# Altium footprint library Atlan.PcbLib: 283 footprints (part 4 of 18)
Each footprint in its own frame and in the unit in brackets; x right, y up, seen from the top. Pads: shape width x height; smd on the part's side, far side on the other; paste and mask are expansions set on the pad; w line width, h text height; cw(c..) or ccw(c..) is an arc to the next point about the centre after c.
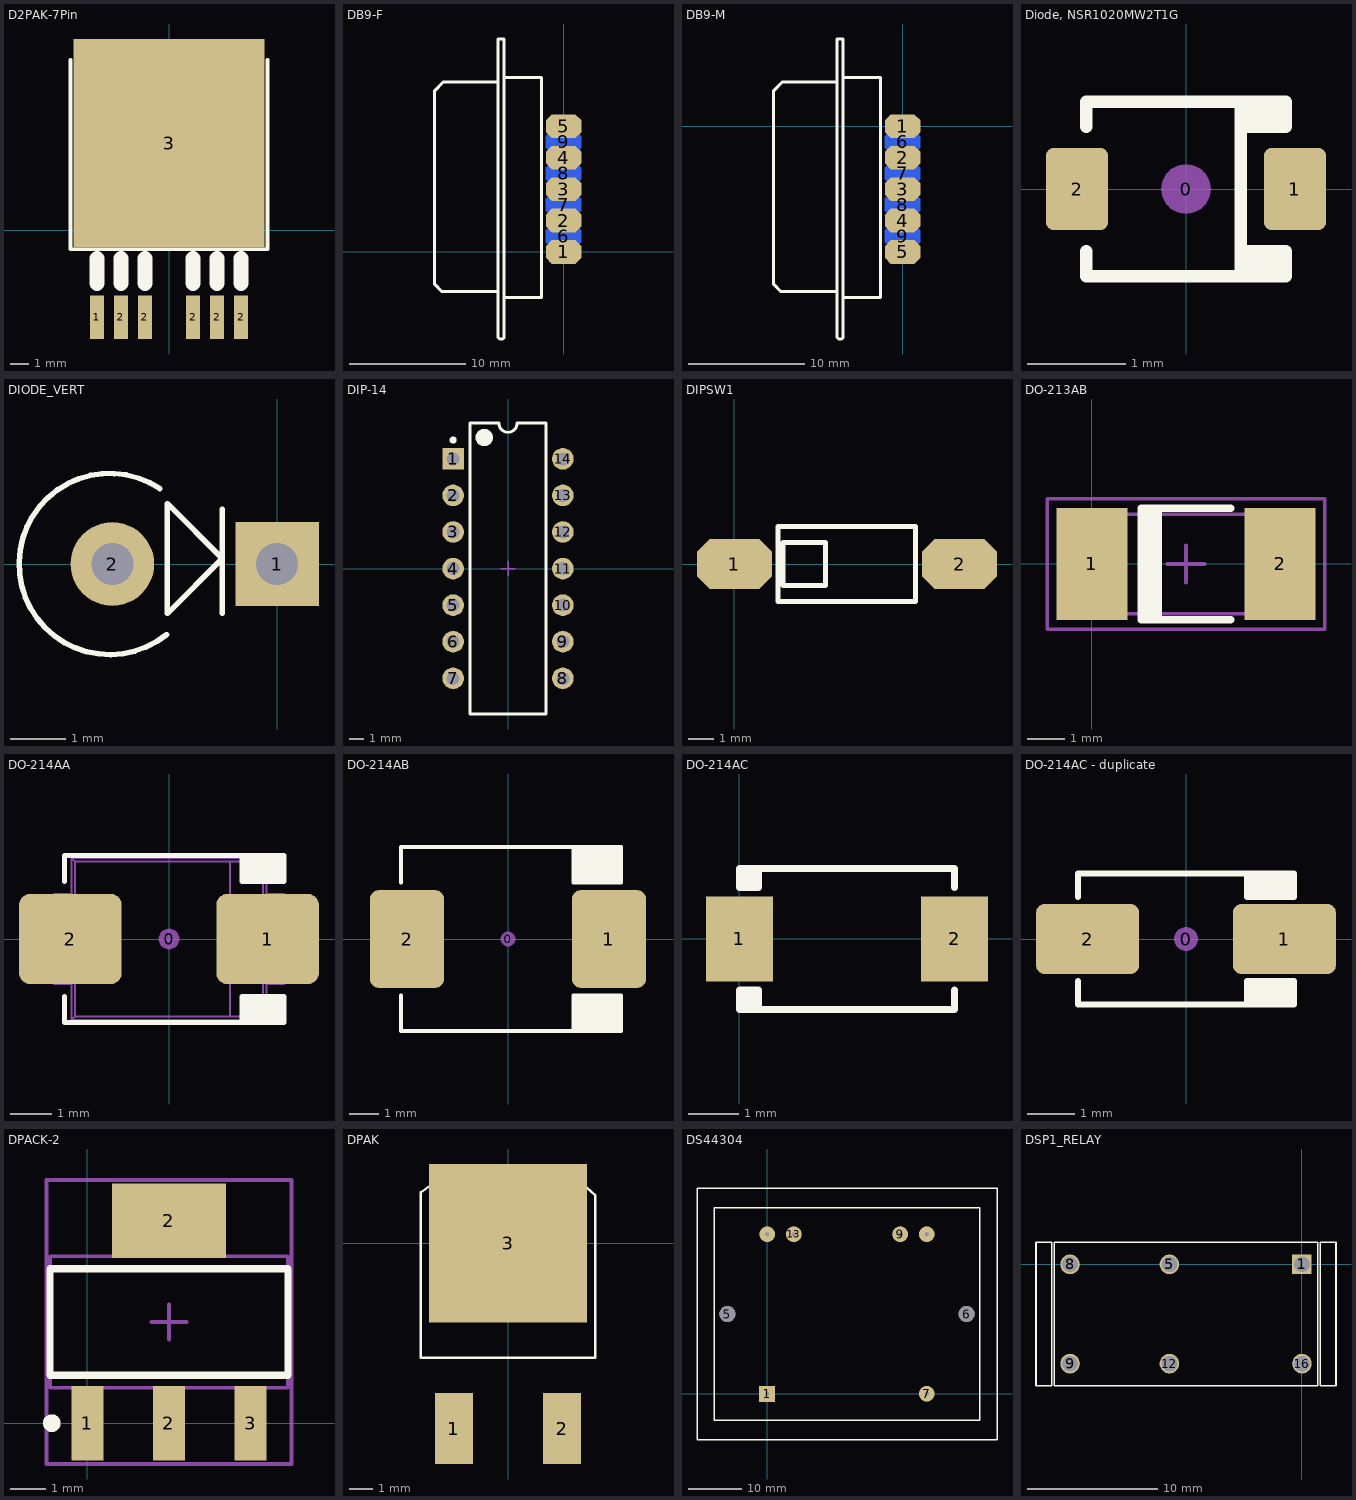
[diagram p3: the footprints below, top view; thin cyan lines are the x and y axes]

## D2PAK-7Pin [mm] "Mosfet"
pads (7):
  rect 0.75x2.285 smd: 1(-3.81,-4.6) 2(-2.54,-4.6) 2(-1.27,-4.6) 2(1.27,-4.6) 2(2.54,-4.6) 2(3.81,-4.6)
  rect 10.095x11 smd: 3(0,4.6)
Top Overlay:
  lines w0.2: -5.2,9 -5.2,-1 5.2,-1 5.2,9
  lines w0.8: -3.81,-2.8 -3.81,-1.5 ; -2.54,-2.8 -2.54,-1.5 ; -1.27,-2.8 -1.27,-1.5 ; 1.27,-2.8 1.27,-1.5 ; 2.54,-2.8 2.54,-1.5 ; 3.8,-2.8 3.8,-1.5
3D body "d2pak7_ST.STEP": height 4.52, standoff 0.02, extent -5.107,-5.5 5.107,9.606

## DB9-F [mil]
pads (9):
  oct 120x80 smd: 1(0,0) 2(0,106.3) 3(0,212.6) 4(0,318.9) 5(0,425.2)
  oct 120x80 smd far side: 6(0,53.15) 7(0,159.45) 8(0,265.75) 9(0,372.05)
Top Overlay:
  lines w10: -221.14,-134.49 -411.14,-134.49 -436.14,-109.49 -436.14,545.51 -406.14,575.51 -221.14,575.51 ; -201.14,-154.49 -201.14,590.51 -75,590.51 -75,-154.49 -201.14,-154.49 ; -201.14,-154.49 -201.14,-289.49 -206.14,-294.49 -216.14,-294.49 -221.14,-289.49 -221.14,720.51 -201.14,720.51 -201.14,-154.49

## DB9-M [mil]
pads (9):
  oct 120x80 smd: 1(0,0) 2(0,-106.3) 3(0,-212.6) 4(0,-318.9) 5(0,-425.2)
  oct 120x80 smd far side: 6(0,-53.15) 7(0,-159.45) 8(0,-265.75) 9(0,-372.05)
Top Overlay:
  lines w10: -221.14,-559.68 -411.14,-559.68 -436.14,-534.68 -436.14,120.31 -406.14,150.32 -221.14,150.31 ; -201.14,-579.68 -201.14,165.31 -75,165.32 -75,-579.69 -201.14,-579.68 ; -201.14,-579.68 -201.14,-714.69 -206.14,-719.69 -216.14,-719.69 -221.14,-714.68 -221.14,295.31 -201.14,295.31 -201.14,-579.68

## Diode, NSR1020MW2T1G [mil]
pads (3):
  round 20 on Mech15: 0(0,0)
  rrect25% 25x33 smd: 1(43.75,0) 2(-43.75,0)
Top Overlay:
  lines w5: -40,-25 -40,-35 40,-35 40,-25 22,-25 ; -40,25 -40,35 40,35 40,25 22,25 ; 22,-35 22,35 ; 25,-35 25,-25 ; 25,25 25,35 ; 28,-35 28,-25 ; 28,25 28,35 ; 31,-35 31,-25 ; 31,25 31,35 ; 34,-35 34,-25 ; 34,25 34,35 ; 37,-35 37,-25 ; 37,25 37,35

## DIODE_VERT [mil]
pads (2):
  rect 60x60 hole 30: 1(0,0)
  round 60 hole 30: 2(-118.11,0)
Top Overlay:
  lines w3.94: -84.05,54.05 ccw(c-120.08,0) -79.26,-50.54
  lines w4: -39.37,-35.43 -39.37,39.37 ; -78.74,-35.43 -78.74,-11.81 -78.74,23.62 -78.74,43.31 -39.37,3.94 -78.74,-35.43
3D body: height 255.91, standoff 0, extent -185.04,-62.99 -55.63,66.67

## DIP-14 [mm] "DIP, 14-Pin, Row Spacing 7.62 mm, Pitch 2.54 mm"
height 5.08
pads (14):
  rect 1.5x1.5 hole 0.9: 1(-3.81,7.62)
  round 1.5 hole 0.9: 2(-3.81,5.08) 3(-3.81,2.54) 4(-3.81,0) 5(-3.81,-2.54) 6(-3.81,-5.08) 7(-3.81,-7.62) 8(3.81,-7.62) 9(3.81,-5.08) 10(3.81,-2.54) 11(3.81,0) 12(3.81,2.54) 13(3.81,5.08) 14(3.81,7.62)
Top Overlay:
  circle w0.6: c-1.65,9.1 r0.3
  circle w0.25: c-3.81,8.92 r0.125
  lines w0.2: -2.65,-10.1 2.65,-10.1 2.65,10.1 0.635,10.1 cw(c0,10.1) -0.635,10.1 -2.65,10.1 -2.65,-10.1
Mechanical 15:
  lines w0.1: -0.5,0 0.5,0 ; 0,-0.5 0,0.5
3D body "DIL14.stp": height 4, standoff -4.3, extent -3.81,-9.6 3.81,9.6

## DIPSW1 [mm]
pads (2):
  oct 3x2 smd: 1(0,0) 2(9,0)
Top Overlay:
  lines w0.2: 1.75,-1.5 7.25,-1.5 7.25,1.5 1.75,1.5 1.75,-1.5 ; 1.942,-0.853 1.942,0.853 3.647,0.853 3.647,-0.853 1.942,-0.853
3D body: height 2.5, standoff 0, extent 1.7,-1.6 7.3,1.6
3D body: height 3.5, standoff 2.5, extent 2.1,-0.7 3.5,0.7
3D body: height 2.51, standoff 2.5, extent 3.5,-0.7 6.7,0.7

## DO-213AB [mm] "MELF Diode, 2-Leads, Body 6,0x2,5mm, IPC Medium Density"
height 2.67
pads (2):
  rect 1.9x3 smd: 1(0,0) 2(5.05,0)
Top Overlay:
  rectangle: 1.325,-1.5 1.875,1.5
  lines w0.2: 3.725,-1.5 1.325,-1.5 1.325,1.5 3.725,1.5
Mechanical 13:
  rectangle: -0.475,-1.335 0.332,1.335
  lines w0.1: -0.475,-1.335 -0.475,1.335 5.525,1.335 5.525,-1.335 -0.475,-1.335
Mechanical 15:
  lines w0.1: 2.025,0 3.025,0 ; 2.525,-0.5 2.525,0.5 ; -1.2,-1.75 -1.2,1.75 6.25,1.75 6.25,-1.75 -1.2,-1.75
3D body: height 2.67, standoff 0, extent -0.475,-1.335 5.525,1.335

## DO-214AA [mm] "JEDEC DO214 variation AA. SMB"
height 2.65
pads (3):
  round 0.508 on Mech15: 0(0,0)
  rrect25% 2.5x2.2 smd: 1(2.4,0) 2(-2.4,0)
Top Overlay:
  region: 1.778,-1.397 1.778,-2.032 2.794,-2.032 2.794,-1.397
  region: 1.778,1.397 1.778,2.032 2.794,2.032 2.794,1.397
  lines w0.127: -2.54,-1.397 -2.54,-2.032 1.778,-2.032 ; -2.54,1.397 -2.54,2.032 1.778,2.032 ; 1.778,-2.032 2.794,-2.032 2.794,-1.397 1.778,-1.397 1.778,-2.032 ; 1.778,2.032 1.778,1.397 2.794,1.397 2.794,2.032 1.778,2.032
Mechanical 13:
  lines w0.05: -2.375,-1.1 -2.375,-1.973 ; -2.375,1.1 -2.375,1.973 ; 2.375,-1.1 2.375,-1.973 ; 2.375,1.1 2.375,1.973 ; -2.375,-1.973 -2.285,-1.883 ; -2.375,-1.973 -2.373,-1.975 2.373,-1.975 2.375,-1.973 ; -2.375,1.973 -2.285,1.883 ; -2.375,1.973 -2.373,1.975 2.373,1.975 2.375,1.973 ; -2.285,-1.883 -2.285,1.883 ; -2.285,-1.883 1.485,-1.884 ; -2.285,1.883 1.485,1.884 ; 1.485,-1.884 1.485,1.884 ; 1.485,-1.884 2.285,-1.884 ; 1.485,1.884 2.285,1.884 ; 2.285,-1.884 2.375,-1.973 ; 2.285,-1.884 2.285,1.884 ; 2.285,1.884 2.375,1.973 ; -2.8,-1.1 -2.8,1.1 -2.356,1.1 -2.356,-1.1 -2.8,-1.1 ; 2.356,-1.1 2.356,1.1 2.8,1.1 2.8,-1.1 2.356,-1.1
3D body "DO-214AA.STEP": height 2.62, standoff 0, extent -2.8,-1.975 2.8,1.975

## DO-214AB [mm] "JEDEC DO214 variation AB. SMC"
height 2.5
pads (3):
  round 0.508 on Mech15: 0(0,0)
  rrect25% 2.5x3.3 smd: 1(3.4,0) 2(-3.4,0)
Top Overlay:
  rectangle: 2.2,1.9 3.8,3.1
  rectangle: 2.2,-3.1 3.8,-1.9
  lines w0.127: -3.6,-1.9 -3.6,-3.1 3.8,-3.1 3.8,-1.9 2.2,-1.9 2.2,-3.1 ; -3.6,1.9 -3.6,3.1 3.8,3.1 3.8,1.9 2.2,1.9 2.2,3.1
3D body: height 2.62, standoff 0.01, extent -3.975,-2.975 4.05,2.975

## DO-214AC [mm] "Diode"
pads (2):
  rect 1.32x1.68 smd: 1(0,0) 2(4.26,0)
Top Overlay:
  lines w0.14: 0,-1.017 0,-1.4 4.26,-1.4 4.26,-1.016 ; 0,-1.016 0.381,-1.016 ; 0.127,-1.4 0.127,-1.016 ; 0.127,1.016 0.127,1.397 ; 0.254,-1.397 0.254,-1.016 ; 0.254,1.016 0.254,1.397 ; 0.381,-1.4 0.381,-1.014 ; 0.381,1.397 0.381,1.016 0,1.016 0,1.397 4.26,1.397 4.26,1.016

## DO-214AC - duplicate [mm] "JEDEC DO214 variation AC. SMA"
height 2.5
pads (3):
  round 0.508 on Mech15: 0(0,0)
  rrect25% 2.2x1.5 smd: 1(2.1,0) 2(-2.1,0)
Top Overlay:
  rectangle: 1.3,-1.4 2.3,-0.9
  rectangle: 1.3,0.9 2.3,1.4
  lines w0.127: -2.3,-0.9 -2.3,-1.4 2.3,-1.4 2.3,-0.9 1.3,-0.9 1.3,-1.4 ; -2.3,0.9 -2.3,1.4 2.3,1.4 2.3,0.9 1.3,0.9 ; 1.3,0.911 1.3,1.4
3D body "SW3dPS-DO-214AC SMA.STEP": height 2.42, standoff 0.02, extent -2.6,-1.3 2.6,1.3

## DPACK-2 [mm]
pads (4):
  rect 0.9x2.1 smd: 1(0,0) 2(2.3,0) 3(4.6,0)
  rect 3.2x2.1 smd: 2(2.3,5.7)
Top Overlay:
  circle w0.25: c-1,0 r0.125
  lines w0.2: -1.05,1.35 -1.05,4.35 5.65,4.35 5.65,1.35 -1.05,1.35
Mechanical 13:
  lines w0.1: -1.05,1 -1.05,4.7 5.65,4.7 5.65,1 -1.05,1
Mechanical 15:
  lines w0.1: 1.8,2.85 2.8,2.85 ; 2.3,2.35 2.3,3.35 ; -1.15,-1.15 -1.15,6.85 5.75,6.85 5.75,-1.15 -1.15,-1.15
3D body: height 1.7, standoff 0, extent -1.05,1 5.65,4.7

## DPAK [mm]
pads (3):
  rect 1.6x3 smd: 1(-2.286,-7.85) 2(2.286,-7.85)
  rect 6.7x6.7 smd: 3(0,0)
Top Overlay:
  lines w0.102: -3.7,-4.85 3.7,-4.85 3.7,2.025 3,2.65 -3,2.65 -3.7,2.15 -3.7,-4.85
3D body "User Library-DPAK_TO-252AA.STEP": height 2.37, standoff -0.03, extent -3.386,-7.6 3.348,2.5

## DS44304 [mm]
pads (8):
  rect 3x3 hole 0.9: 1(0,0)
  round 3 hole 3 unplated: 5(-7.5,15) 6(37.5,15)
  round 3 hole 0.9: 7(30,0) 9(25,30) 13(5,30) ""(0,30) ""(30,30)
Top Overlay:
  lines w0.25: -13.2,-8.65 43.2,-8.65 43.2,38.65 -13.2,38.65 -13.2,-8.65 ; -10,-5 -10,35 40,35 40,-5 -10,-5
3D body: height 32, standoff 0, extent -13.2,-8.65 43.2,38.65
3D body: height 39, standoff 0, extent -10,-5.05 40.1,34.95

## DSP1_RELAY [mm]
pads (6):
  rect 1.5x1.5 hole 1.2: 1(0,0)
  round 1.5 hole 1.2: 5(-10.16,0) 8(-17.78,0) 9(-17.78,-7.62) 12(-10.16,-7.62) 16(0,-7.62)
Top Overlay:
  lines w0.127: -20.39,-9.31 -19.19,-9.31 -19.19,1.69 -20.39,1.69 -20.39,-9.31 ; -18.99,-9.31 -18.99,1.69 1.21,1.69 1.21,-9.31 -18.99,-9.31 ; 1.41,-9.31 2.61,-9.31 2.61,1.69 1.41,1.69 1.41,-9.31
3D body: height 5.7, standoff 0, extent -19.19,-9.31 1.41,1.69
3D body: height 13.3, standoff 0, extent 1.41,-9.31 2.61,1.69
3D body: height 13.3, standoff 0, extent -20.39,-9.31 -19.19,1.69
3D body: height 13, standoff 3.7, extent -18.99,-9.31 1.21,1.69